# Altium footprint library Cty1.PcbLib: 1378 footprints (part 47 of 87)
Each footprint in its own frame and in the unit in brackets; x right, y up, seen from the top. Pads: shape width x height; smd on the part's side, far side on the other; paste and mask are expansions set on the pad; w line width, h text height; cw(c..) or ccw(c..) is an arc to the next point about the centre after c.
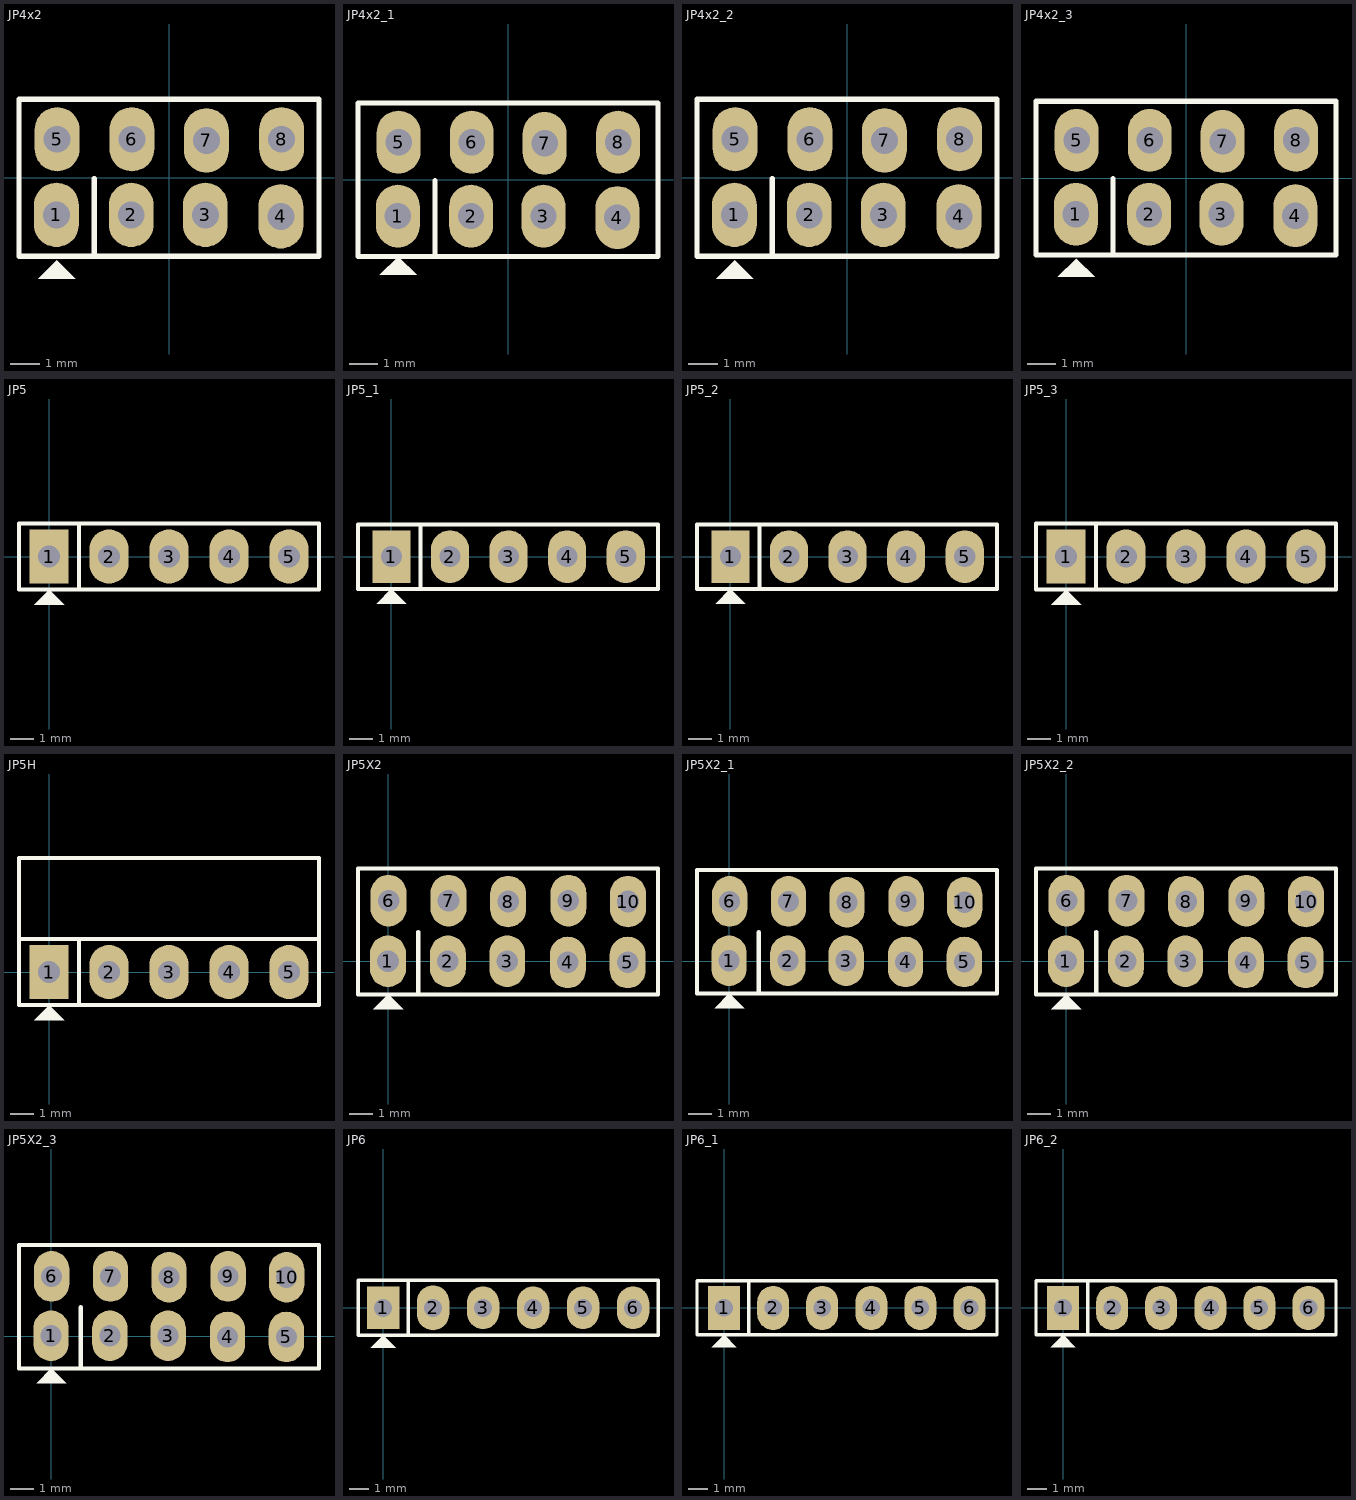
[diagram p46: the footprints below, top view; thin cyan lines are the x and y axes]

## JP4x2 [mil] "Connector 4x2"
height 200
pads (8):
  oval 60x86 hole 36: 1(-150.5,-49.5) 2(-50.5,-49.5) 3(48.5,-49.5) 4(149.5,-51.5) 5(-149.5,51.5) 6(-49.5,51.5) 7(50,50) 8(150.5,51.5)
Top Overlay:
  region: -150,-110 -175,-135 -125,-135
  lines w7: -100,-105 -100,-1 ; -200.5,-105 -200.5,0.5 -200.5,105 200.5,105 200.5,-105 -200.5,-105
3D body "JP2-4.stp": height 366.14, standoff -86.61, extent -196.99,-99.99 203.01,100.01

## JP4x2_1 [mil] "Connector 4x2"
height 200
pads (8):
  oval 60x86 hole 36: 1(-150.5,-49.5) 2(-50.5,-49.5) 3(48.5,-49.5) 4(149.5,-51.5) 5(-149.5,51.5) 6(-49.5,51.5) 7(50,50) 8(150.5,51.5)
Top Overlay:
  region: -150,-105 -175,-130 -125,-130
  lines w7: -100,-105 -100,-1 ; -205,-105 -205,105 205,105 205,-105 -205,-105
3D body "female_header_a-bl254-dg-g08d.stp": height 366.14, standoff -94.49, extent -204.72,-98.43 205.12,98.43

## JP4x2_2 [mil] "Connector 4x2"
height 200
pads (8):
  oval 60x86 hole 36: 1(-150.5,-49.5) 2(-50.5,-49.5) 3(48.5,-49.5) 4(149.5,-51.5) 5(-149.5,51.5) 6(-49.5,51.5) 7(50,50) 8(150.5,51.5)
Top Overlay:
  region: -150,-110 -175,-135 -125,-135
  lines w7: -100,-105 -100,-1 ; -200.5,-105 200.5,-105 200.5,105 -200.5,105 -200.5,0.5 -200.5,-105
3D body "pin_header_awl254-da-g08d.stp": height 216.54, standoff -98.43, extent -199.8,-60.63 200.2,446.46

## JP4x2_3 [mil] "Connector 4x2"
height 200
pads (8):
  oval 60x86 hole 36: 1(-150.5,-49.5) 2(-50.5,-49.5) 3(48.5,-49.5) 4(149.5,-51.5) 5(-149.5,51.5) 6(-49.5,51.5) 7(50,50) 8(150.5,51.5)
Top Overlay:
  region: -150,-110 -175,-135 -125,-135
  lines w7: -100,-105 -100,-1 ; -205,-105 205,-105 205,105 -205,105 -205,-105
3D body "female_header_a-bl254-da-g08d.stp": height 216.54, standoff -106.3, extent -204.92,-56.41 204.93,439.65

## JP5 [mil] "JP5"
height 200
pads (5):
  rect 65x90 hole 36: 1(0,0)
  oval 65x90 hole 36: 2(100,0) 3(200,0) 4(300,0) 5(400,0)
Top Overlay:
  region: 0,-55 -25,-80 25,-80
  lines w7: 50,-55 50,55 ; -50,-55 -50,55 450,55 450,-55 -50,-55
3D body "JP1-5.stp": height 354.33, standoff -86.61, extent -49.99,-49.21 446.07,49.22

## JP5_1 [mil] "JP5"
height 200
pads (5):
  rect 65x90 hole 36: 1(0,0)
  oval 65x90 hole 36: 2(100,0) 3(200,0) 4(300,0) 5(400,0)
Top Overlay:
  region: 0,-55 -25,-80 25,-80
  lines w7: 50,-55 50,55 ; -57,-55 -57,55 455,55 455,-55 -57,-55
3D body "female_header_a-bl254-eg-g05d.stp": height 366.14, standoff -94.49, extent -54.84,-48.43 455,50

## JP5_2 [mil] "JP5"
height 200
pads (5):
  rect 65x90 hole 36: 1(0,0)
  oval 65x90 hole 36: 2(100,0) 3(200,0) 4(300,0) 5(400,0)
Top Overlay:
  region: 0,-55 -25,-80 25,-80
  lines w7: 50,-55 50,55 ; -57,-55 -57,55 455,55 455,-55 -57,-55
3D body "female_header_a-bl254-ea-g05d.stp": height 108.27, standoff -116.14, extent -55.12,-9.06 454.73,387.01

## JP5_3 [mil] "JP5"
height 200
pads (5):
  rect 65x90 hole 36: 1(0,0)
  oval 65x90 hole 36: 2(100,0) 3(200,0) 4(300,0) 5(400,0)
Top Overlay:
  region: 0,-55 -25,-80 25,-80
  lines w7: 50,-55 50,55 ; -50,-55 -50,55 450,55 450,-55 -50,-55
3D body "jumper5.STEP": height 311.81, standoff -126.77, extent -44.29,-242.13 447.84,49.21

## JP5H [mil]
pads (5):
  rect 65x90 hole 36: 1(0,0)
  oval 65x90 hole 36: 2(100,0) 3(200,0) 4(300,0) 5(400,0)
Top Overlay:
  region: 0,-55 -25,-80 25,-80
  lines w7: -50,-55 450,-55 450,65 ; 50,-55 50,55 ; -50,55 -50,190 450,190 450,55 -50,55
  lines w7.01: -50,-55 -50,65
3D body "JP5H.stp": height 108.27, standoff -84.65, extent -46.06,-14.96 446.07,423.63

## JP5X2 [mil]
pads (10):
  oval 60x86 hole 36: 1(-0.5,0.5) 2(99.5,0.5) 3(198.5,0.5) 4(299.5,-1.5) 5(399.5,-1.5) 6(0.5,101.5) 7(100.5,101.5) 8(200,100) 9(300.5,101.5) 10(400,100)
Top Overlay:
  region: 0,-55 -25,-80 25,-80
  lines w7: 50,-55 50,49 ; -50.5,-55 -50.5,50.5 -50.5,155 450,155 450,-55 -50.5,-55
3D body "JP5X2.stp": height 366.14, standoff -86.61, extent -49.99,-49.99 450.01,150.01

## JP5X2_1 [mil]
pads (10):
  oval 60x86 hole 36: 1(-0.5,0.5) 2(99.5,0.5) 3(198.5,0.5) 4(299.5,-1.5) 5(399.5,-1.5) 6(0.5,101.5) 7(100.5,101.5) 8(200,100) 9(300.5,101.5) 10(400,100)
Top Overlay:
  region: 0,-55 -25,-80 25,-80
  lines w7: 50,-55 50,49 ; -55,-55 455,-55 455,155 -55,155 -55,-55
3D body "female_header_a-bl254-dg-g10d.stp": height 366.14, standoff -94.49, extent -55.12,-47.24 454.73,149.61

## JP5X2_2 [mil]
pads (10):
  oval 60x86 hole 36: 1(-0.5,0.5) 2(99.5,0.5) 3(198.5,0.5) 4(299.5,-1.5) 5(399.5,-1.5) 6(0.5,101.5) 7(100.5,101.5) 8(200,100) 9(300.5,101.5) 10(400,100)
Top Overlay:
  region: 0,-55 -25,-80 25,-80
  lines w7: 50,-55 50,49 ; -50.5,-55 -50.5,50.5 -50.5,155 450,155 450,-55 -50.5,-55
3D body "pin_header_awl254-da-g10d.stp": height 216.54, standoff -98.43, extent -49.21,-11.42 450.79,495.67

## JP5X2_3 [mil]
pads (10):
  oval 60x86 hole 36: 1(-0.5,0.5) 2(99.5,0.5) 3(198.5,0.5) 4(299.5,-1.5) 5(399.5,-1.5) 6(0.5,101.5) 7(100.5,101.5) 8(200,100) 9(300.5,101.5) 10(400,100)
Top Overlay:
  region: 0,-55 -25,-80 25,-80
  lines w7: 50,-55 50,49 ; -55,-55 -55,155 455,155 455,-55 -55,-55
3D body "female_header_a-bl254-da-g10d.stp": height 216.54, standoff -106.3, extent -53.15,-4.92 456.69,491.14

## JP6 [mil] "JP6"
height 200
pads (6):
  rect 65x85 hole 36: 1(0,0)
  oval 65x90 hole 36: 2(100,0)
  oval 65x85 hole 36: 3(200,0) 4(300,0) 5(400,0) 6(500,0)
Top Overlay:
  region: 0,-55 -25,-80 25,-80
  lines w7: 50,-55 50,53 ; -50,-55 550,-55 550,55 -50,55 -50,-55
3D body "JP1-6.stp": height 354.33, standoff -86.61, extent -48.03,-50 548.03,48.43

## JP6_1 [mil] "JP6"
height 200
pads (6):
  rect 65x90 hole 36: 1(0,0)
  oval 65x90 hole 36: 2(100,0) 3(200,0) 4(300,0) 5(400,0) 6(500,0)
Top Overlay:
  region: 0,-55 -25,-80 25,-80
  lines w7: 50,-55 50,55 ; -55,-55 -55,55 556,55 556,-55 -55,-55
3D body "female_header_a-bl254-eg-g06d.stp": height 366.14, standoff -94.49, extent -54.92,-48.43 554.92,50

## JP6_2 [mil] "JP6"
height 200
pads (6):
  rect 65x90 hole 36: 1(0,0)
  oval 65x90 hole 36: 2(100,0) 3(200,0) 4(300,0) 5(400,0) 6(500,0)
Top Overlay:
  region: 0,-55 -25,-80 25,-80
  lines w7: 50,-55 50,55 ; -55,-55 -55,55 556,55 556,-55 -55,-55
3D body "female_header_a-bl254-ea-g06d.stp": height 108.27, standoff -116.14, extent -54.13,-9.84 555.71,386.22